# Altium footprint library DebouncingToolESD.PcbLib: 30 footprints (part 1 of 2)
Each footprint in its own frame and in the unit in brackets; x right, y up, seen from the top. Pads: shape width x height; smd on the part's side, far side on the other; paste and mask are expansions set on the pad; w line width, h text height; cw(c..) or ccw(c..) is an arc to the next point about the centre after c.
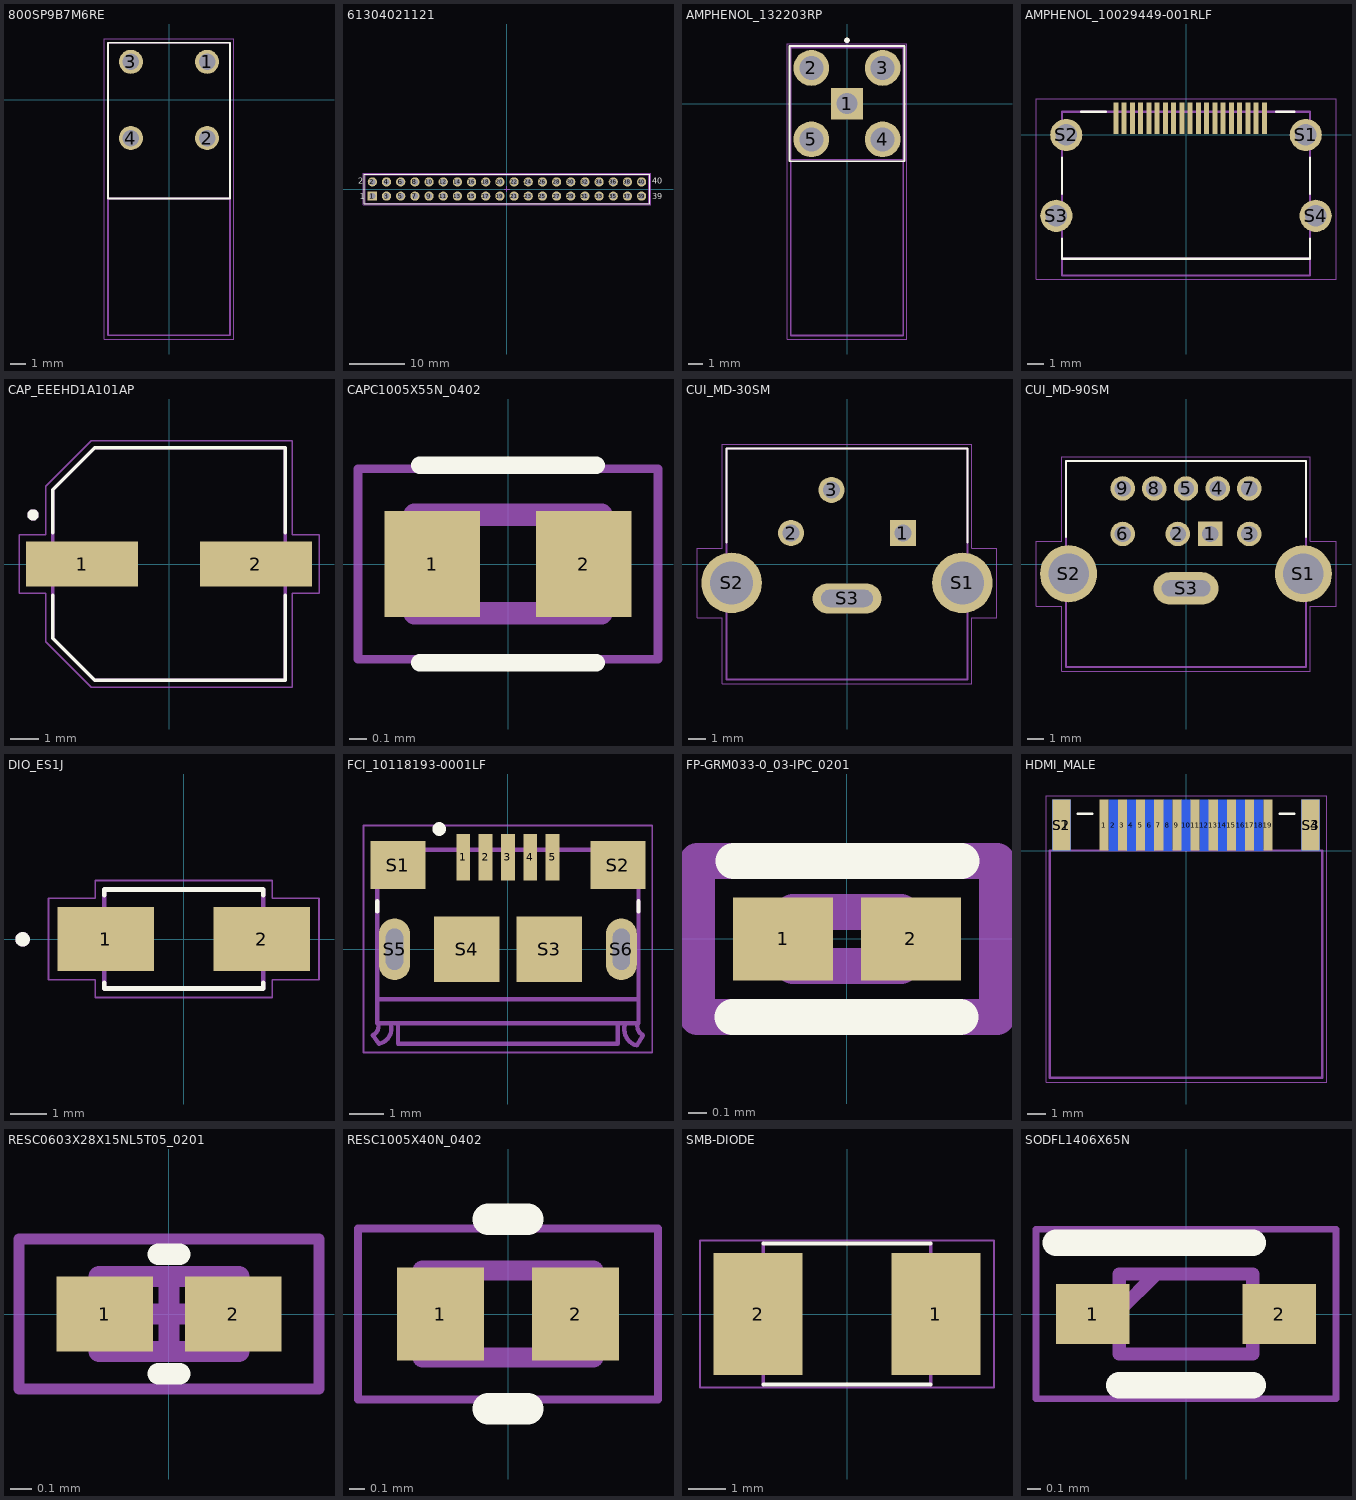
[diagram p0: the footprints below, top view; thin cyan lines are the x and y axes]

## 800SP9B7M6RE [mm]
pads (4):
  round 1.6 hole 1.1: 1(2.54,2.54) 2(2.54,-2.54) 3(-2.54,2.54) 4(-2.54,-2.54)
Top Overlay:
  lines w0.127: -4.064,-6.553 -4.064,3.81 4.064,3.81 4.064,-6.553 -4.064,-6.553
Mechanical 13:
  lines w0.127: -4.064,-6.553 4.064,-6.553 ; -4.064,-15.672 4.064,-15.672 4.064,3.81 -4.064,3.81 -4.064,-15.672
Mechanical 15:
  lines w0.05: 4.314,4.06 4.314,-15.922 -4.318,-15.922 -4.314,4.06 4.318,4.06
3D body "800SP9B6M6RE--3DModel-STEP-56544.STEP": height 6.05, standoff -3.3, extent -4.065,-15.68 4.065,3.08

## 61304021121 [mm] "Pin Header, pitch 2.54 mm, THT, Vertical, dual row, 40p"
height 8.54
pads (40):
  rect 1.65x1.65 hole 1.1: 1(-24.13,-1.27)
  round 1.65 hole 1.1: 2(-24.13,1.27) 3(-21.59,-1.27) 4(-21.59,1.27) 5(-19.05,-1.27) 6(-19.05,1.27) 7(-16.51,-1.27) 8(-16.51,1.27) 9(-13.97,-1.27) 10(-13.97,1.27) 11(-11.43,-1.27) 12(-11.43,1.27) 13(-8.89,-1.27) 14(-8.89,1.27) 15(-6.35,-1.27) 16(-6.35,1.27) 17(-3.81,-1.27) 18(-3.81,1.27) 19(-1.27,-1.27) 20(-1.27,1.27) 21(1.27,-1.27) 22(1.27,1.27) 23(3.81,-1.27) 24(3.81,1.27) 25(6.35,-1.27) 26(6.35,1.27) 27(8.89,-1.27) 28(8.89,1.27) 29(11.43,-1.27) 30(11.43,1.27) 31(13.97,-1.27) 32(13.97,1.27) 33(16.51,-1.27) 34(16.51,1.27) 35(19.05,-1.27) 36(19.05,1.27) 37(21.59,-1.27) 38(21.59,1.27) 39(24.13,-1.27) 40(24.13,1.27)
Top Overlay:
  lines w0.2: -25.55,-2.615 -25.55,2.615 25.55,2.615 25.55,-2.615 -25.55,-2.615
  text "1" at -26.4,-1.8 h1.02
  text "2" at -26.7,0.9 h1.02
  text "40" at 26.05,0.9 h1.02
  text "39" at 26.05,-1.8 h1.02
Mechanical 13:
  lines w0.1: -25.4,-2.54 -25.4,2.54 25.4,2.54 25.4,-2.54 -25.4,-2.54
Mechanical 15:
  lines w0.05: -0.5,0 0.5,0 ; 0,-0.5 0,0.5 ; -25.75,-2.815 25.75,-2.815 25.75,2.815 -25.75,2.815 -25.75,-2.815
3D body "61304021121.stp": height 8.59, standoff -2.95, extent -25.4,-2.54 25.4,2.54

## AMPHENOL_132203RP [mm]
pads (5):
  rect 2.25x2.25 hole 1.5: 1(0,0)
  round 2.55 hole 1.7: 2(-2.54,2.54) 3(2.54,2.54) 4(2.54,-2.54) 5(-2.54,-2.54)
Top Overlay:
  circle w0.2: c0,4.5 r0.1
  lines w0.127: -4.102,-4.102 -4.102,4.102 4.102,4.102 4.102,-4.102 -4.102,-4.102
Mechanical 13:
  lines w0.127: -4,-4 -4,-16.5 4,-16.5 4,-4 ; -4,-4 -4,4 4,4 4,-4 ; -4,-4 4,-4
Mechanical 15:
  lines w0.05: -4.25,-16.75 -4.25,4.25 4.25,4.25 4.25,-16.75 -4.25,-16.75
3D body "132203Modif.STEP": height 10.47, standoff -3.91, extent -4,-16.5 4,4

## AMPHENOL_10029449-001RLF [mm]
pads (23):
  rect 0.3x1.9 smd: 1(4.75,1) 2(4.25,1) 3(3.75,1) 4(3.25,1) 5(2.75,1) 6(2.25,1) 7(1.75,1) 8(1.25,1) 9(0.75,1) 10(0.25,1) 11(-0.25,1) 12(-0.75,1) 13(-1.25,1) 14(-1.75,1) 15(-2.25,1) 16(-2.75,1) 17(-3.25,1) 18(-3.75,1) 19(-4.25,1)
  round 1.95 hole 1.3: S1(7.25,0) S2(-7.25,0) S3(-7.85,-4.9) S4(7.85,-4.9)
Top Overlay:
  lines w0.127: -7.5,-6.27 -7.5,-7.5 7.5,-7.5 7.5,-6.27 ; -7.5,-3.56 -7.5,-1.37 ; -6.35,1.4 -4.85,1.4 ; 5.45,1.4 6.55,1.4 ; 7.5,-3.56 7.5,-1.37
Mechanical 13:
  lines w0.127: -7.5,-7.5 7.5,-7.5 ; -7.5,-7.5 -7.5,1.4 7.5,1.4 7.5,-7.5 ; -7.5,-7.5 -7.5,-8.5 7.5,-8.5 7.5,-7.5
  text "PCB EDGE" at -3.048,-7.343 h0.81
Mechanical 15:
  lines w0.05: -9.08,-8.75 -9.08,2.2 9.08,2.2 9.08,-8.75 -9.08,-8.75
3D body "10029449-001RLF--3DModel-STEP-56544.STEP": height 6.3, standoff -2.1, extent -8.1,-8.6 8.1,1.3

## CAP_EEEHD1A101AP [mm]
pads (2):
  rect 4x1.6 smd: 1(-3.1,0) 2(3.1,0)
Top Overlay:
  circle w0.2: c-4.85,1.75 r0.1
  lines w0.127: -4.15,-1.12 -4.15,-2.65 -2.65,-4.15 4.15,-4.15 4.15,-1.12 ; -4.15,1.12 -4.15,2.65 -2.65,4.15 4.15,4.15 4.15,1.12
Mechanical 13:
  circle w0.2: c-4.85,1.75 r0.1
  lines w0.127: -4.15,-2.65 -2.65,-4.15 4.15,-4.15 4.15,4.15 -2.65,4.15 -4.15,2.65 -4.15,-2.65
Mechanical 15:
  lines w0.05: -5.35,-1.05 -5.35,1.05 -4.4,1.05 -4.4,2.775 -2.775,4.4 4.4,4.4 4.4,1.05 5.35,1.05 5.35,-1.05 4.4,-1.05 4.4,-4.4 -2.775,-4.4 -4.4,-2.775 -4.4,-1.05 -5.35,-1.05
3D body "step_temp.STEP": height 6.2, standoff 0, extent -4.5,-4.15 4.5,4.15

## CAPC1005X55N_0402 [mm]
pads (2):
  rect 0.54x0.6 smd: 1(-0.43,0) 2(0.43,0)
Top Overlay:
  lines w0.1: -0.5,-0.559 0.5,-0.559 ; -0.5,0.559 0.5,0.559
Mechanical 13:
  lines w0.127: -0.53,-0.28 -0.53,0.28 0.53,0.28 0.53,-0.28 -0.53,-0.28
Mechanical 15:
  lines w0.05: -0.85,-0.54 -0.85,0.54 0.85,0.54 0.85,-0.54 -0.85,-0.54
3D body "LMK105BJ563KV-F.STEP": height 0.5, standoff 0, extent -0.5,-0.275 0.5,0.275

## CUI_MD-30SM [mm]
pads (6):
  rect 1.508x1.508 hole 1: 1(3.25,1.8)
  round 1.508 hole 1: 2(-3.25,1.8) 3(-0.9,4.3)
  round 3.516 hole 2.5: S1(6.7,-1.1) S2(-6.7,-1.1)
  oval 4x1.75 hole 1 slot 3 at 0 deg: S3(0,-2)
Top Overlay:
  lines w0.127: -7,1.25 -7,6.7 7,6.7 7,1.25
Mechanical 13:
  lines w0.127: -7,-6.7 -7,6.7 7,6.7 7,-6.7 -7,-6.7
Mechanical 15:
  lines w0.05: -8.71,-3.11 -8.71,0.91 -7.25,0.91 -7.25,6.95 7.25,6.95 7.25,0.91 8.71,0.91 8.71,-3.11 7.25,-3.11 7.25,-6.95 -7.25,-6.95 -7.25,-3.11 -8.71,-3.11
3D body "CUI_DEVICES_MD-30SM.step": height 12.8, standoff -3.8, extent -7.02,-6.7 7.03,6.7

## CUI_MD-90SM [mm]
pads (12):
  rect 1.508x1.508 hole 1: 1(1.5,1.85)
  round 1.508 hole 1: 2(-0.5,1.85) 3(3.9,1.85) 4(1.95,4.65) 5(0,4.65) 6(-3.9,1.85) 7(3.9,4.65) 8(-1.95,4.65) 9(-3.9,4.65)
  round 3.516 hole 2.5: S1(7.225,-0.6) S2(-7.225,-0.6)
  oval 4x2 hole 1 slot 3 at 0 deg: S3(0,-1.5)
Top Overlay:
  lines w0.127: -7.4,1.65 -7.4,6.35 7.4,6.35 7.4,1.65
Mechanical 13:
  lines w0.127: -7.4,-6.35 -7.4,6.35 7.4,6.35 7.4,-6.35 -7.4,-6.35
Mechanical 15:
  lines w0.05: -9.235,-2.61 -9.235,1.41 -7.65,1.41 -7.65,6.6 7.65,6.6 7.65,1.41 9.235,1.41 9.235,-2.61 7.65,-2.61 7.65,-6.6 -7.65,-6.6 -7.65,-2.61 -9.235,-2.61
3D body "CUI_DEVICES_MD-90SM(downloaded) - Copy.step": height 12.9, standoff -3.7, extent -7.542,-6.363 7.558,6.337

## DIO_ES1J [mm]
pads (2):
  rect 2.65x1.75 smd: 1(-2.15,0) 2(2.15,0)
Top Overlay:
  circle w0.2: c-4.44,-0.01 r0.1
  lines w0.127: -2.187,-1.2 -2.187,-1.362 2.187,-1.362 2.187,-1.2 ; -2.187,1.2 -2.187,1.362 2.187,1.362 2.187,1.2
Mechanical 13:
  circle w0.2: c-4.44,-0.01 r0.1
  lines w0.127: -2.187,-1.362 2.187,-1.362 2.187,1.362 -2.187,1.362 -2.187,-1.362
Mechanical 15:
  lines w0.05: -3.725,-1.125 -2.438,-1.125 -2.438,-1.613 2.438,-1.613 2.438,-1.125 3.725,-1.125 3.725,1.125 2.438,1.125 2.438,1.613 -2.438,1.613 -2.438,1.125 -3.725,1.125 -3.725,-1.125
3D body "Diode SS14.STEP": height 2.25, standoff 0, extent -2.5,-1.362 2.5,1.338

## FCI_10118193-0001LF [mm]
pads (11):
  rect 0.4x1.35 smd: 1(-1.3,2.675) 2(-0.65,2.675) 3(0,2.675) 4(0.65,2.675) 5(1.3,2.675)
  rect 1.6x1.4 smd: S1(-3.2,2.45) S2(3.2,2.45)
  rect 1.9x1.9 smd: S3(1.2,0) S4(-1.2,0)
  oval 0.9x1.8 hole 0.5 slot 1.2 at 90 deg: S5(-3.3,0) S6(3.3,0)
Top Overlay:
  circle w0.2: c-2,3.5 r0.1
  lines w0.127: -3.8,1.1 -3.8,1.4 ; 3.8,1.1 3.8,1.4
Mechanical 13:
  lines w0.127: -3.93,-2.5 -3.75,-2.75 ; -3.93,-2.5 ccw(c-4.065,-2.235) -3.8,-2.1 ; -3.8,-1.45 3.8,-1.45 ; -3.746,-2.749 ccw(c-3.85,-2.3) -3.401,-2.196 ; -3.2,-2.2 -3.2,-2.75 3.2,-2.75 3.2,-2.2 ; 3.401,-2.198 ccw(c3.875,-2.325) 3.748,-2.799 ; 3.75,-2.8 3.93,-2.5 ; 3.8,-2.1 ccw(c4.065,-2.235) 3.93,-2.5 ; -3.8,-2.1 -3.8,-2.15 3.8,-2.15 3.8,-1.45 ; -3.8,-2.1 -3.8,2.9 3.8,2.9 3.8,-1.45
Mechanical 15:
  lines w0.05: -4.2,-3 -4.2,3.6 4.2,3.6 4.2,-3 -4.2,-3
3D body "10118193-0001LF--3DModel-STEP-56544.STEP": height 2.84, standoff -0.76, extent -3.93,-2.76 3.93,2.95

## FP-GRM033-0_03-IPC_0201 [mm]
pads (2):
  rect 0.554x0.463 smd: 1(-0.354,0) 2(0.354,0)
Top Overlay:
  lines w0.2: -0.635,-0.432 0.628,-0.432 ; -0.628,0.432 0.635,0.432
Mechanical 13:
  lines w0.2: -0.3,-0.15 -0.3,0.15 0.3,0.15 0.3,-0.15 -0.3,-0.15
Mechanical 15:
  lines w0.2: -0.831,-0.431 -0.831,0.431 0.831,0.431 0.831,-0.431 -0.831,-0.431
3D body "GRM033R61E431KA01D.STEP": height 0.3, standoff 0, extent -0.3,-0.165 0.3,0.165

## HDMI_MALE [mm]
pads (23):
  rect 0.5x2.8 smd: 1(-4.5,1.4) 3(-3.5,1.4) 5(-2.5,1.4) 7(-1.5,1.4) 9(-0.5,1.4) 11(0.5,1.4) 13(1.5,1.4) 15(2.5,1.4) 17(3.5,1.4) 19(4.5,1.4)
  rect 0.5x2.8 smd far side: 2(-4,1.4) 4(-3,1.4) 6(-2,1.4) 8(-1,1.4) 10(0,1.4) 12(1,1.4) 14(2,1.4) 16(3,1.4) 18(4,1.4)
  rect 1x2.8 smd: S1(-6.85,1.4) S3(6.85,1.4)
  rect 1x2.8 smd far side: S2(-6.85,1.4) S4(6.85,1.4)
Top Overlay:
  lines w0.127: -5.95,2.032 -5.15,2.032 ; 5.15,2.032 5.95,2.032
Mechanical 13:
  lines w0.127: -7.493,-12.5 -7.493,0 7.493,0 7.493,-12.5 -7.493,-12.5
Mechanical 15:
  lines w0.05: -7.693,-12.75 -7.693,3.025 7.743,3.025 7.743,-12.75 -7.693,-12.75
3D body "hdmi-connector.STEP": height 1.9, standoff -3.65, extent -7.5,-12.5 7.5,1.7

## RESC0603X28X15NL5T05_0201 [mm] "Chip Resistor, 2-Leads, Body 0.65x0.35mm, IPC Medium Density"
height 0.28
pads (2):
  rect 0.45x0.35 smd: 1(-0.3,0) 2(0.3,0)
Top Overlay:
  lines w0.1: -0.049,-0.279 0.051,-0.279 ; -0.049,0.279 0.051,0.279
Mechanical 13:
  lines w0.1: -0.325,-0.175 -0.325,0.175 0.325,0.175 0.325,-0.175 -0.325,-0.175
Mechanical 15:
  lines w0.05: -0.7,-0.35 -0.7,0.35 0.7,0.35 0.7,-0.35 -0.7,-0.35
  lines w0.1: -0.175,0 0.175,0 ; 0,-0.175 0,0.175
3D body "RESC0603X03N.step": height 0.28, standoff 0, extent -0.325,-0.175 0.325,0.175

## RESC1005X40N_0402 [mm]
pads (2):
  rect 0.56x0.6 smd: 1(-0.435,0) 2(0.435,0)
Top Overlay:
  lines w0.2: -0.127,-0.61 0.127,-0.61 ; -0.127,0.61 0.127,0.61
Mechanical 13:
  lines w0.127: -0.55,-0.28 -0.55,0.28 0.55,0.28 0.55,-0.28 -0.55,-0.28
Mechanical 15:
  lines w0.05: -0.965,-0.55 -0.965,0.55 0.965,0.55 0.965,-0.55 -0.965,-0.55
3D body "CRG0402F4K7.STEP": height 0.4, standoff 0, extent -0.5,-0.25 0.5,0.25

## SMB-DIODE [mm]
pads (2):
  rect 2.4x3.3 smd: 1(2.4,0) 2(-2.4,0)
Top Overlay:
  lines w0.102: -2.261,-1.905 2.261,-1.905 ; -2.261,1.905 2.261,1.905
Mechanical 13:
  region: 2.794,-1.092 2.261,-1.092 2.261,1.092 2.794,1.092
  region: -2.261,-1.092 -2.794,-1.092 -2.794,1.092 -2.261,1.092
  lines w0.102: -2.261,-1.905 -2.261,1.905 ; 2.261,-1.905 2.261,1.905
Mechanical 15:
  lines w0.051: -3.973,-1.983 -3.973,1.983 3.973,1.983 3.973,-1.983 -3.973,-1.983
3D body "SMBJ5.0CA.STEP": height 2.6, standoff -0.01, extent -2.699,-1.81 2.699,1.81

## SODFL1406X65N [mm]
pads (2):
  rect 0.55x0.45 smd: 1(-0.7,0) 2(0.7,0)
Top Overlay:
  lines w0.2: -0.975,0.533 0.5,0.533 ; -0.5,-0.533 0.5,-0.533
Mechanical 13:
  lines w0.1: -0.5,0.025 -0.225,0.3 ; -0.5,-0.3 -0.5,0.3 0.5,0.3 0.5,-0.3 -0.5,-0.3
Mechanical 15:
  lines w0.05: -1.125,-0.635 -1.125,0.635 1.125,0.635 1.125,-0.635 -1.125,-0.635
3D body "SP1003-01DTG.stp": height 0.65, standoff 0, extent -0.7,-0.3 0.7,0.3